# Altium footprint library Components.PcbLib: 260 footprints (part 5 of 17)
Each footprint in its own frame and in the unit in brackets; x right, y up, seen from the top. Pads: shape width x height; smd on the part's side, far side on the other; paste and mask are expansions set on the pad; w line width, h text height; cw(c..) or ccw(c..) is an arc to the next point about the centre after c.
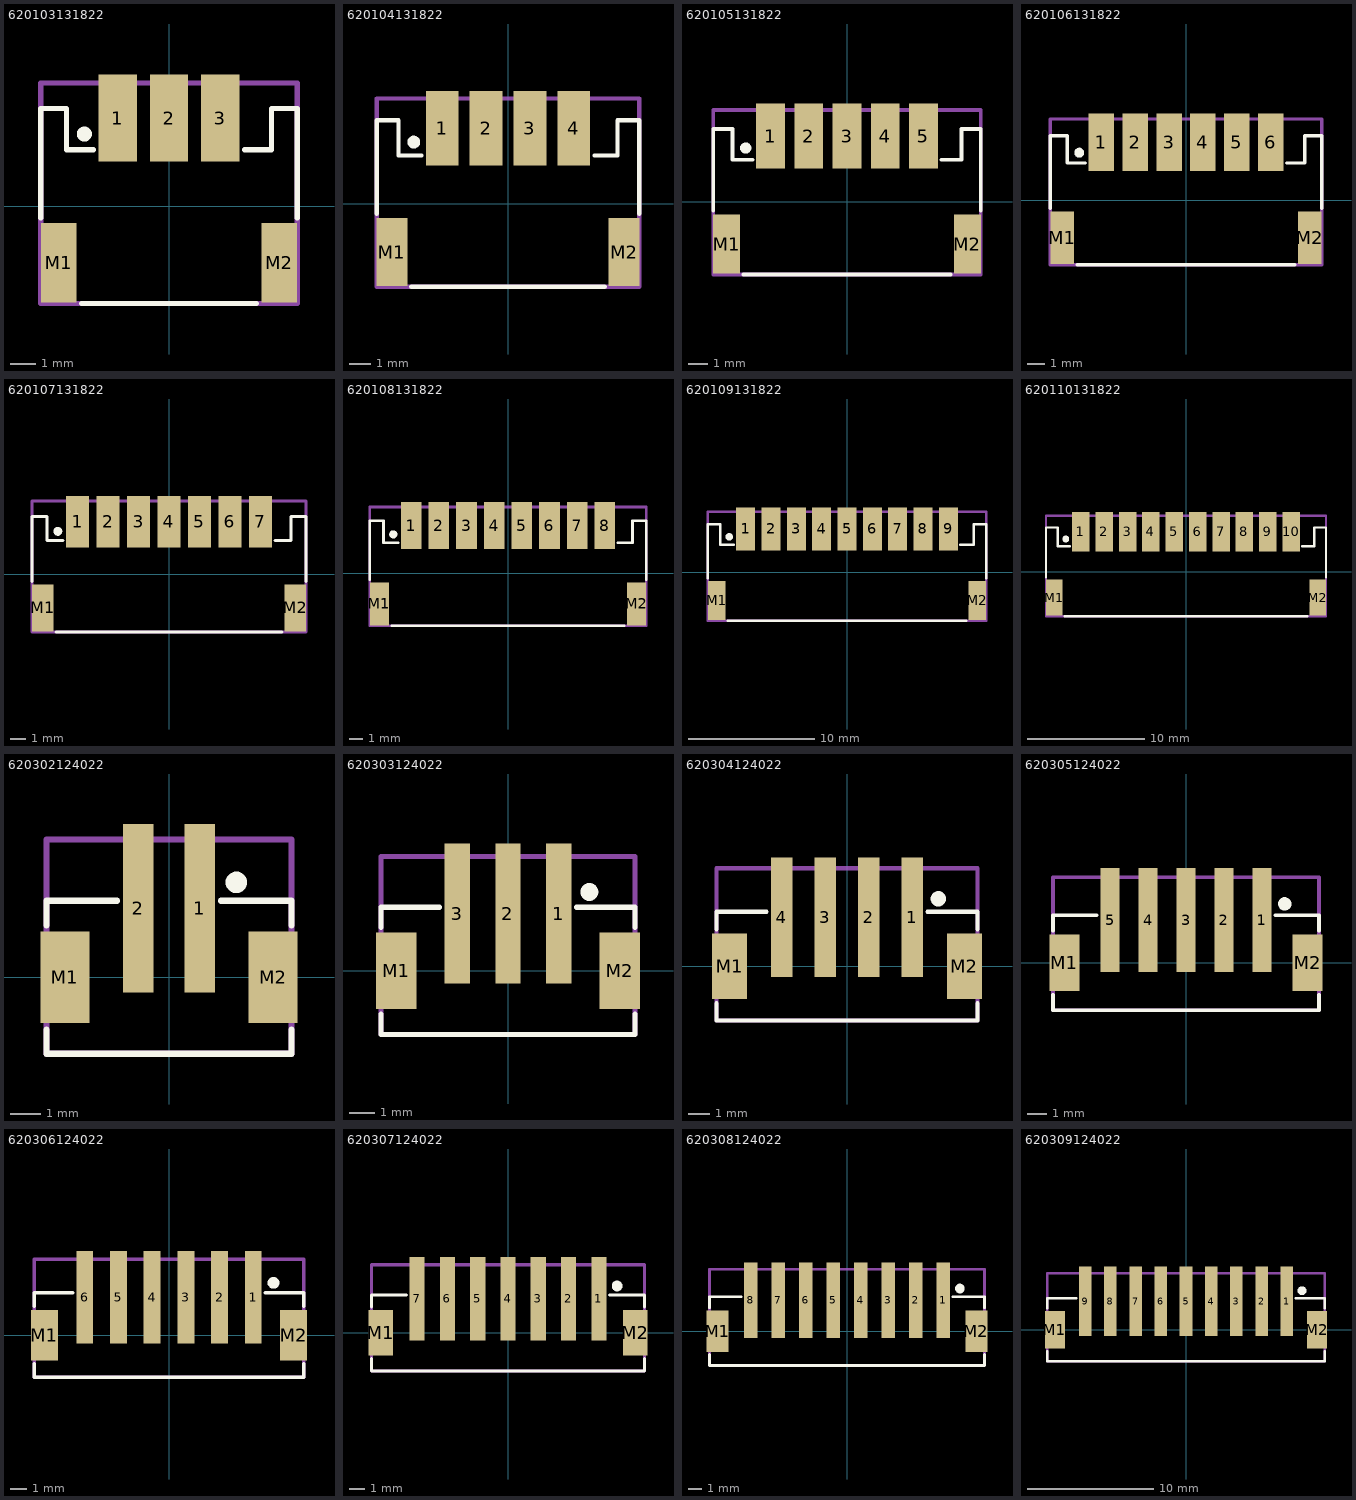
[diagram p4: the footprints below, top view; thin cyan lines are the x and y axes]

## 620103131822 [mm] "2.00mm SMT Male Horizontal Shrouded Header, 3p"
height 5.6
pads (5):
  rect 1.5x3.4 smd: 1(-2,3.435) 2(0,3.435) 3(2,3.435)
  rect 1.4x3.1 smd: M1(-4.3,-2.215) M2(4.3,-2.215)
Top Overlay:
  circle w0.3: c-3.3,2.81 r0.141
  lines w0.2: -5,-0.47 -5,3.8 -4,3.8 -4,2.2 -2.95,2.2 ; -3.41,-3.8 3.41,-3.8 ; 2.95,2.2 4,2.2 4,3.8 5,3.8 5,-0.47
Mechanical 13:
  lines w0.2: -5,-3.8 5,-3.8 5,4.8 -5,4.8 -5,-3.8
3D body "620103131822.stp": height 5.65, standoff 0, extent -5,-3.8 5,4.8

## 620104131822 [mm] "2.00mm SMT Male Horizontal Shrouded Header, 4p"
height 5.6
pads (6):
  rect 1.5x3.4 smd: 1(-3,3.435) 2(-1,3.435) 3(1,3.435) 4(3,3.435)
  rect 1.4x3.1 smd: M1(-5.3,-2.215) M2(5.3,-2.215)
Top Overlay:
  circle w0.3: c-4.3,2.81 r0.141
  lines w0.2: -6,-0.47 -6,3.8 -5,3.8 -5,2.2 -3.95,2.2 ; -4.41,-3.8 4.41,-3.8 ; 3.95,2.2 5,2.2 5,3.8 6,3.8 6,-0.47
Mechanical 13:
  lines w0.2: -6,-3.8 -6,4.8 6,4.8 6,-3.8 -6,-3.8
3D body "620104131822.stp": height 5.65, standoff 0, extent -6,-3.8 6,4.8

## 620105131822 [mm] "2.00mm SMT Male Horizontal Shrouded Header, 5p"
height 5.6
pads (7):
  rect 1.5x3.4 smd: 1(-4,3.435) 2(-2,3.435) 3(0,3.435) 4(2,3.435) 5(4,3.435)
  rect 1.4x3.1 smd: M1(-6.3,-2.215) M2(6.3,-2.215)
Top Overlay:
  circle w0.3: c-5.3,2.81 r0.141
  lines w0.2: -7,-0.47 -7,3.8 -6,3.8 -6,2.2 -4.95,2.2 ; -5.41,-3.8 5.41,-3.8 ; 4.95,2.2 6,2.2 6,3.8 7,3.8 7,-0.47
Mechanical 13:
  lines w0.2: -7,-3.8 7,-3.8 7,4.8 -7,4.8 -7,-3.8
3D body "620105131822.stp": height 5.65, standoff 0, extent -7,-3.8 7,4.8

## 620106131822 [mm] "2.00mm SMT Male Horizontal Shrouded Header, 6p"
height 5.6
pads (8):
  rect 1.5x3.4 smd: 1(-5,3.435) 2(-3,3.435) 3(-1,3.435) 4(1,3.435) 5(3,3.435) 6(5,3.435)
  rect 1.4x3.1 smd: M1(-7.3,-2.215) M2(7.3,-2.215)
Top Overlay:
  circle w0.3: c-6.3,2.81 r0.141
  lines w0.2: -8,-0.47 -8,3.8 -7,3.8 -7,2.2 -5.95,2.2 ; -6.41,-3.8 6.41,-3.8 ; 5.95,2.2 7,2.2 7,3.8 8,3.8 8,-0.47
Mechanical 13:
  lines w0.2: -8,-3.8 -8,4.8 8,4.8 8,-3.8 -8,-3.8
3D body "620106131822.stp": height 5.65, standoff 0, extent -8,-3.8 8,4.8

## 620107131822 [mm] "2.00mm SMT Male Horizontal Shrouded Header, 7p"
height 5.6
pads (9):
  rect 1.5x3.4 smd: 1(-6,3.435) 2(-4,3.435) 3(-2,3.435) 4(0,3.435) 5(2,3.435) 6(4,3.435) 7(6,3.435)
  rect 1.4x3.1 smd: M1(-8.3,-2.215) M2(8.3,-2.215)
Top Overlay:
  circle w0.3: c-7.3,2.81 r0.141
  lines w0.2: -9,-0.47 -9,3.8 -8,3.8 -8,2.2 -6.95,2.2 ; -7.41,-3.8 7.41,-3.8 ; 6.95,2.2 8,2.2 8,3.8 9,3.8 9,-0.47
Mechanical 13:
  lines w0.2: -9,-3.8 -9,4.8 9,4.8 9,-3.8 -9,-3.8
3D body "620107131822.stp": height 5.65, standoff 0, extent -9,-3.8 9,4.8

## 620108131822 [mm] "2.00mm SMT Male Horizontal Shrouded Header, 8p"
height 5.6
pads (10):
  rect 1.5x3.4 smd: 1(-7,3.435) 2(-5,3.435) 3(-3,3.435) 4(-1,3.435) 5(1,3.435) 6(3,3.435) 7(5,3.435) 8(7,3.435)
  rect 1.4x3.1 smd: M1(-9.3,-2.215) M2(9.3,-2.215)
Top Overlay:
  circle w0.3: c-8.3,2.81 r0.141
  lines w0.2: -10,-0.47 -10,3.8 -9,3.8 -9,2.2 -7.95,2.2 ; -8.41,-3.8 8.41,-3.8 ; 7.95,2.2 9,2.2 9,3.8 10,3.8 10,-0.47
Mechanical 13:
  lines w0.2: -10,-3.8 -10,4.8 10,4.8 10,-3.8 -10,-3.8
3D body "620108131822.stp": height 5.65, standoff 0, extent -10,-3.8 10,4.8

## 620109131822 [mm] "2.00mm SMT Male Horizontal Shrouded Header, 9p"
height 5.6
pads (11):
  rect 1.5x3.4 smd: 1(-8,3.435) 2(-6,3.435) 3(-4,3.435) 4(-2,3.435) 5(0,3.435) 6(2,3.435) 7(4,3.435) 8(6,3.435) 9(8,3.435)
  rect 1.4x3.1 smd: M1(-10.3,-2.215) M2(10.3,-2.215)
Top Overlay:
  circle w0.3: c-9.3,2.81 r0.141
  lines w0.2: -11,-0.47 -11,3.8 -10,3.8 -10,2.2 -8.95,2.2 ; -9.41,-3.8 9.41,-3.8 ; 8.95,2.2 10,2.2 10,3.8 11,3.8 11,-0.47
Mechanical 13:
  lines w0.2: -11,-3.8 -11,4.8 11,4.8 11,-3.8 -11,-3.8
3D body "620109131822.stp": height 5.65, standoff 0, extent -11,-3.8 11,4.8

## 620110131822 [mm] "2.00mm SMT Male Horizontal Shrouded Header, 10p"
height 5.6
pads (12):
  rect 1.5x3.4 smd: 1(-9,3.435) 2(-7,3.435) 3(-5,3.435) 4(-3,3.435) 5(-1,3.435) 6(1,3.435) 7(3,3.435) 8(5,3.435) 9(7,3.435) 10(9,3.435)
  rect 1.4x3.1 smd: M1(-11.3,-2.215) M2(11.3,-2.215)
Top Overlay:
  circle w0.3: c-10.3,2.81 r0.141
  lines w0.2: -12,-0.47 -12,3.8 -11,3.8 -11,2.2 -9.95,2.2 ; -10.41,-3.8 10.41,-3.8 ; 9.95,2.2 11,2.2 11,3.8 12,3.8 12,-0.47
Mechanical 13:
  lines w0.2: -12,-3.8 -12,4.8 12,4.8 12,-3.8 -12,-3.8
3D body "620110131822.stp": height 5.65, standoff 0, extent -12,-3.8 12,4.8

## 620302124022 [mm] "2.00mm SMT Male Vertical Shrouded Header, 2p"
height 6.86
pads (4):
  rect 1x5.5 smd: 1(1,2.25) 2(-1,2.25)
  rect 1.6x3 smd: M1(-3.4,0) M2(3.4,0)
Top Overlay:
  circle w0.5: c2.2,3.1 r0.1
  lines w0.2: -4,-1.7 -4,-2.5 4,-2.5 ; -4,1.7 -4,2.5 -1.7,2.5 ; 1.7,2.5 4,2.5 4,1.7 ; 4,-2.5 4,-1.7
Mechanical 13:
  lines w0.2: -4,-2.5 -4,4.5 4,4.5 4,-2.5 -4,-2.5
3D body "620302124022.stp": height 6.75, standoff -0.03, extent -4,-2.5 4,4.51

## 620303124022 [mm] "2.00mm SMT Male Vertical Shrouded Header, 3p"
height 6.86
pads (5):
  rect 1x5.5 smd: 1(2,2.25) 2(0,2.25) 3(-2,2.25)
  rect 1.6x3 smd: M1(-4.4,0) M2(4.4,0)
Top Overlay:
  circle w0.5: c3.2,3.1 r0.1
  lines w0.2: -5,-1.7 -5,-2.5 5,-2.5 5,-1.7 ; -5,1.7 -5,2.5 -2.7,2.5 ; 2.7,2.5 5,2.5 5,1.7
Mechanical 13:
  lines w0.2: -5,-2.5 -5,4.5 5,4.5 5,-2.5 -5,-2.5
3D body "620303124022.stp": height 6.75, standoff -0.03, extent -5,-2.5 5,4.51

## 620304124022 [mm] "2.00mm SMT Male Vertical Shrouded Header, 4p"
height 6.86
pads (6):
  rect 1x5.5 smd: 1(3,2.25) 2(1,2.25) 3(-1,2.25) 4(-3,2.25)
  rect 1.6x3 smd: M1(-5.4,0) M2(5.4,0)
Top Overlay:
  circle w0.5: c4.2,3.1 r0.1
  lines w0.2: -6,-1.7 -6,-2.5 6,-2.5 6,-1.7 ; -6,1.7 -6,2.5 -3.7,2.5 ; 3.7,2.5 6,2.5 6,1.7
Mechanical 13:
  lines w0.2: -6,-2.5 6,-2.5 6,4.5 -6,4.5 -6,-2.5
3D body "620304124022.stp": height 6.75, standoff -0.03, extent -6,-2.5 6,4.51

## 620305124022 [mm] "2.00mm SMT Male Vertical Shrouded Header, 5p"
height 6.86
pads (7):
  rect 1x5.5 smd: 1(4,2.25) 2(2,2.25) 3(0,2.25) 4(-2,2.25) 5(-4,2.25)
  rect 1.6x3 smd: M1(-6.4,0) M2(6.4,0)
Top Overlay:
  circle w0.5: c5.2,3.1 r0.1
  lines w0.2: -7,-1.7 -7,-2.5 7,-2.5 7,-1.7 ; -7,1.7 -7,2.5 -4.7,2.5 ; 4.7,2.5 7,2.5 7,1.7
Mechanical 13:
  lines w0.2: -7,-2.5 -7,4.5 7,4.5 7,-2.5 -7,-2.5
3D body "620305124022.stp": height 6.75, standoff -0.03, extent -7,-2.5 7,4.51

## 620306124022 [mm] "2.00mm SMT Male Vertical Shrouded Header, 6p"
height 6.86
pads (8):
  rect 1x5.5 smd: 1(5,2.25) 2(3,2.25) 3(1,2.25) 4(-1,2.25) 5(-3,2.25) 6(-5,2.25)
  rect 1.6x3 smd: M1(-7.4,0) M2(7.4,0)
Top Overlay:
  circle w0.5: c6.2,3.1 r0.1
  lines w0.2: -8,-1.7 -8,-2.5 8,-2.5 8,-1.7 ; -8,1.7 -8,2.5 -5.7,2.5 ; 5.7,2.5 8,2.5 8,1.7
Mechanical 13:
  lines w0.2: -8,-2.5 8,-2.5 8,4.5 -8,4.5 -8,-2.5
3D body "620306124022.stp": height 6.75, standoff -0.03, extent -8,-2.5 8,4.51

## 620307124022 [mm] "2.00mm SMT Male Vertical Shrouded Header, 7p"
height 6.86
pads (9):
  rect 1x5.5 smd: 1(6,2.25) 2(4,2.25) 3(2,2.25) 4(0,2.25) 5(-2,2.25) 6(-4,2.25) 7(-6,2.25)
  rect 1.6x3 smd: M1(-8.4,0) M2(8.4,0)
Top Overlay:
  circle w0.5: c7.2,3.1 r0.1
  lines w0.2: -9,-1.7 -9,-2.5 9,-2.5 ; -9,1.7 -9,2.5 -6.7,2.5 ; 6.7,2.5 9,2.5 9,1.7 ; 9,-2.5 9,-1.7
Mechanical 13:
  lines w0.2: -9,-2.5 -9,4.5 9,4.5 9,-2.5 -9,-2.5
3D body "620307124022.stp": height 6.75, standoff -0.03, extent -9,-2.5 9,4.51

## 620308124022 [mm] "2.00mm SMT Male Vertical Shrouded Header, 8p"
height 6.86
pads (10):
  rect 1x5.5 smd: 1(7,2.25) 2(5,2.25) 3(3,2.25) 4(1,2.25) 5(-1,2.25) 6(-3,2.25) 7(-5,2.25) 8(-7,2.25)
  rect 1.6x3 smd: M1(-9.4,0) M2(9.4,0)
Top Overlay:
  circle w0.5: c8.2,3.1 r0.1
  lines w0.2: -10,-1.7 -10,-2.5 10,-2.5 10,-1.7 ; -10,1.7 -10,2.5 -7.7,2.5 ; 7.7,2.5 10,2.5 10,1.7
Mechanical 13:
  lines w0.2: -10,-2.5 10,-2.5 10,4.5 -10,4.5 -10,-2.5
3D body "620308124022.stp": height 6.75, standoff -0.03, extent -10,-2.5 10,4.51

## 620309124022 [mm] "2.00mm SMT Male Vertical Shrouded Header, 9p"
height 6.86
pads (11):
  rect 1x5.5 smd: 1(8,2.25) 2(6,2.25) 3(4,2.25) 4(2,2.25) 5(0,2.25) 6(-2,2.25) 7(-4,2.25) 8(-6,2.25) 9(-8,2.25)
  rect 1.6x3 smd: M1(-10.4,0) M2(10.4,0)
Top Overlay:
  circle w0.5: c9.2,3.1 r0.1
  lines w0.2: -11,-1.7 -11,-2.5 11,-2.5 11,-1.7 ; -11,1.7 -11,2.5 -8.7,2.5 ; 8.7,2.5 11,2.5 11,1.7
Mechanical 13:
  lines w0.2: -11,-2.5 -11,4.5 11,4.5 11,-2.5 -11,-2.5
3D body "620309124022.stp": height 6.75, standoff -0.03, extent -11,-2.5 11,4.51